# Altium footprint library WR-TBL_Spring Clamp.PcbLib: 258 footprints (part 8 of 17)
Each footprint in its own frame and in the unit in brackets; x right, y up, seen from the top. Pads: shape width x height; smd on the part's side, far side on the other; paste and mask are expansions set on the pad; w line width, h text height; cw(c..) or ccw(c..) is an arc to the next point about the centre after c.
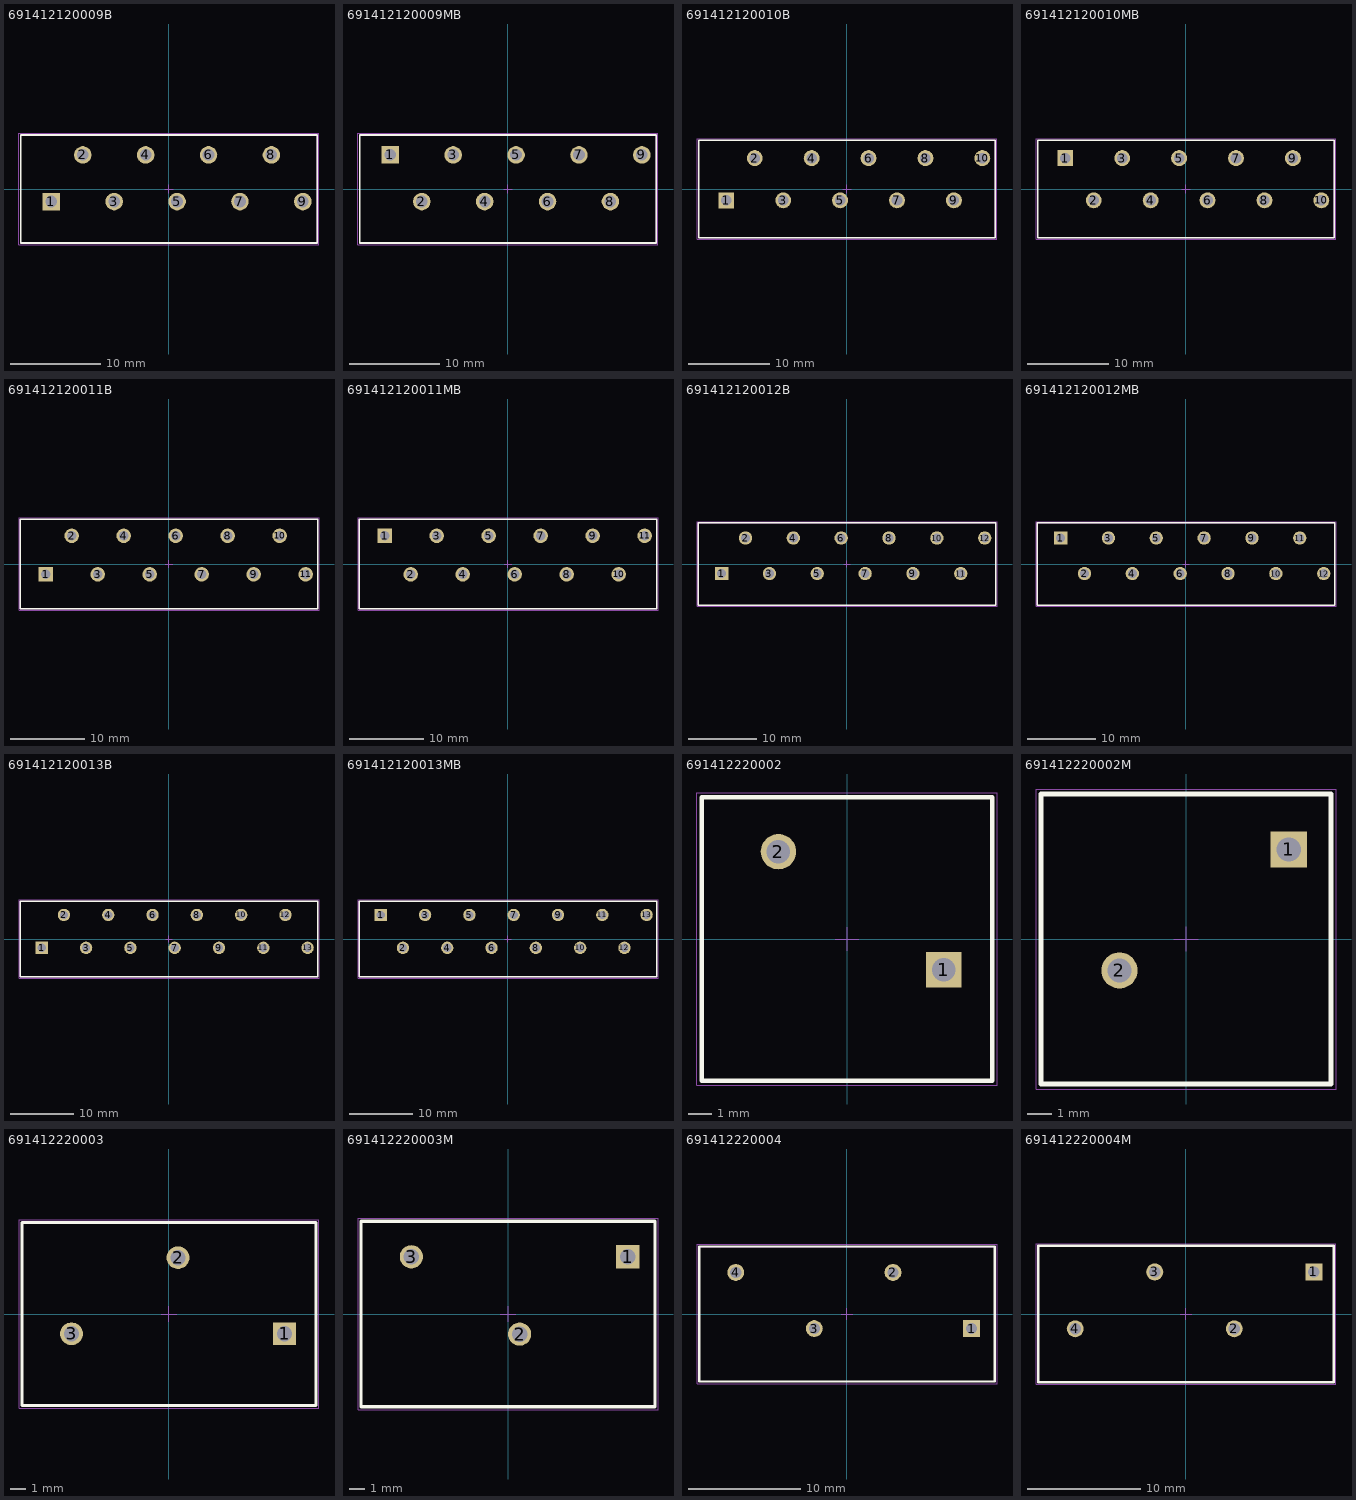
[diagram p7: the footprints below, top view; thin cyan lines are the x and y axes]

## 691412120009B [mm] "3,5mm - Spring clamp/Screw less - 45¡ã entry - 09p"
height 12.8
pads (9):
  rect 1.95x1.95 hole 1.3: 1(-13.1,-1.4)
  round 1.95 hole 1.3: 2(-9.6,3.8) 3(-6.1,-1.4) 4(-2.6,3.8) 5(0.9,-1.4) 6(4.4,3.8) 7(7.9,-1.4) 8(11.4,3.8) 9(14.9,-1.4)
Top Overlay:
  lines w0.2: -16.5,-6 -16.5,6 16.5,6 16.5,-6 -16.5,-6
Mechanical 13:
  lines w0.1: -16.5,-6 16.5,-6 16.5,6 -16.5,6 -16.5,-6
Mechanical 15:
  lines w0.05: -0.5,0 0.5,0 ; 0,-0.5 0,0.5 ; -16.7,-6.2 -16.7,6.2 16.7,6.2 16.7,-6.2 -16.7,-6.2
3D body "691412120009B.stp": height 12.85, standoff -3.45, extent -16.5,-6 16.5,6

## 691412120009MB [mm] "3,5mm - Spring clamp/Screw less - 45¡ã entry - 09p"
height 11.5
pads (9):
  rect 1.95x1.95 hole 1.3: 1(-13.1,3.8)
  round 1.95 hole 1.3: 2(-9.6,-1.4) 3(-6.1,3.8) 4(-2.6,-1.4) 5(0.9,3.8) 6(4.4,-1.4) 7(7.9,3.8) 8(11.4,-1.4) 9(14.9,3.8)
Top Overlay:
  lines w0.2: -16.5,-6 16.5,-6 16.5,6 -16.5,6 -16.5,-6
Mechanical 13:
  lines w0.1: -16.5,-6 -16.5,6 16.5,6 16.5,-6 -16.5,-6
Mechanical 15:
  lines w0.05: -0.5,0 0.5,0 ; 0,-0.5 0,0.5 ; -16.7,-6.2 -16.7,6.2 16.7,6.2 16.7,-6.2 -16.7,-6.2
3D body "691412120009MB.stp": height 12.85, standoff -3.45, extent -16.5,-6 16.5,6

## 691412120010B [mm] "3,5mm - Spring clamp/Screw less - 45¡ã entry - 10p"
height 12.8
pads (10):
  rect 1.95x1.95 hole 1.3: 1(-14.85,-1.4)
  round 1.95 hole 1.3: 2(-11.35,3.8) 3(-7.85,-1.4) 4(-4.35,3.8) 5(-0.85,-1.4) 6(2.65,3.8) 7(6.15,-1.4) 8(9.65,3.8) 9(13.15,-1.4) 10(16.65,3.8)
Top Overlay:
  lines w0.2: -18.25,-6 -18.25,6 18.25,6 18.25,-6 -18.25,-6
Mechanical 13:
  lines w0.1: -18.25,-6 18.25,-6 18.25,6 -18.25,6 -18.25,-6
Mechanical 15:
  lines w0.05: -0.5,0 0.5,0 ; 0,-0.5 0,0.5 ; -18.45,-6.2 -18.45,6.2 18.45,6.2 18.45,-6.2 -18.45,-6.2
3D body "691412120010B.stp": height 12.85, standoff -3.45, extent -18.25,-6 18.25,6

## 691412120010MB [mm] "3,5mm - Spring clamp/Screw less - 45¡ã entry - 10p"
height 11.5
pads (10):
  rect 1.95x1.95 hole 1.3: 1(-14.85,3.8)
  round 1.95 hole 1.3: 2(-11.35,-1.4) 3(-7.85,3.8) 4(-4.35,-1.4) 5(-0.85,3.8) 6(2.65,-1.4) 7(6.15,3.8) 8(9.65,-1.4) 9(13.15,3.8) 10(16.65,-1.4)
Top Overlay:
  lines w0.2: -18.25,-6 -18.25,6 18.25,6 18.25,-6 -18.25,-6
Mechanical 13:
  lines w0.1: -18.25,-6 18.25,-6 18.25,6 -18.25,6 -18.25,-6
Mechanical 15:
  lines w0.05: -0.5,0 0.5,0 ; 0,-0.5 0,0.5 ; -18.45,-6.2 18.45,-6.2 18.45,6.2 -18.45,6.2 -18.45,-6.2
3D body "691412120010MB.stp": height 12.85, standoff -3.45, extent -18.25,-6 18.25,6

## 691412120011B [mm] "3,5mm - Spring clamp/Screw less - 45¡ã entry - 11p"
height 12.8
pads (11):
  rect 1.95x1.95 hole 1.3: 1(-16.6,-1.4)
  round 1.95 hole 1.3: 2(-13.1,3.8) 3(-9.6,-1.4) 4(-6.1,3.8) 5(-2.6,-1.4) 6(0.9,3.8) 7(4.4,-1.4) 8(7.9,3.8) 9(11.4,-1.4) 10(14.9,3.8) 11(18.4,-1.4)
Top Overlay:
  lines w0.2: -20,-6 20,-6 20,6 -20,6 -20,-6
Mechanical 13:
  lines w0.1: -20,-6 -20,6 20,6 20,-6 -20,-6
Mechanical 15:
  lines w0.05: -0.5,0 0.5,0 ; 0,-0.5 0,0.5 ; -20.2,-6.2 20.2,-6.2 20.2,6.2 -20.2,6.2 -20.2,-6.2
3D body "691412120011B.stp": height 12.85, standoff -3.45, extent -20,-6 20,6

## 691412120011MB [mm] "3,5mm - Spring clamp/Screw less - 45¡ã entry - 11p"
height 11.5
pads (11):
  rect 1.95x1.95 hole 1.3: 1(-16.6,3.8)
  round 1.95 hole 1.3: 2(-13.1,-1.4) 3(-9.6,3.8) 4(-6.1,-1.4) 5(-2.6,3.8) 6(0.9,-1.4) 7(4.4,3.8) 8(7.9,-1.4) 9(11.4,3.8) 10(14.9,-1.4) 11(18.4,3.8)
Top Overlay:
  lines w0.2: -20,-6 -20,6 20,6 20,-6 -20,-6
Mechanical 13:
  lines w0.1: -20,-6 20,-6 20,6 -20,6 -20,-6
Mechanical 15:
  lines w0.05: -0.5,0 0.5,0 ; 0,-0.5 0,0.5 ; -20.2,-6.2 20.2,-6.2 20.2,6.2 -20.2,6.2 -20.2,-6.2
3D body "691412120011MB.stp": height 12.85, standoff -3.45, extent -20,-6 20,6

## 691412120012B [mm] "3,5mm - Spring clamp/Screw less - 45¡ã entry - 12p"
height 12.8
pads (12):
  rect 1.95x1.95 hole 1.3: 1(-18.35,-1.4)
  round 1.95 hole 1.3: 2(-14.85,3.8) 3(-11.35,-1.4) 4(-7.85,3.8) 5(-4.35,-1.4) 6(-0.85,3.8) 7(2.65,-1.4) 8(6.15,3.8) 9(9.65,-1.4) 10(13.15,3.8) 11(16.65,-1.4) 12(20.15,3.8)
Top Overlay:
  lines w0.2: -21.75,-6 21.75,-6 21.75,6 -21.75,6 -21.75,-6
Mechanical 13:
  lines w0.1: -21.75,-6 -21.75,6 21.75,6 21.75,-6 -21.75,-6
Mechanical 15:
  lines w0.05: -0.5,0 0.5,0 ; 0,-0.5 0,0.5 ; -21.95,-6.2 21.95,-6.2 21.95,6.2 -21.95,6.2 -21.95,-6.2
3D body "691412120012B.stp": height 12.85, standoff -3.45, extent -21.75,-6 21.75,6

## 691412120012MB [mm] "3,5mm - Spring clamp/Screw less - 45¡ã entry - 12p"
height 11.5
pads (12):
  rect 1.95x1.95 hole 1.3: 1(-18.35,3.8)
  round 1.95 hole 1.3: 2(-14.85,-1.4) 3(-11.35,3.8) 4(-7.85,-1.4) 5(-4.35,3.8) 6(-0.85,-1.4) 7(2.65,3.8) 8(6.15,-1.4) 9(9.65,3.8) 10(13.15,-1.4) 11(16.65,3.8) 12(20.15,-1.4)
Top Overlay:
  lines w0.2: -21.75,-6 -21.75,6 21.75,6 21.75,-6 -21.75,-6
Mechanical 13:
  lines w0.1: -21.75,-6 21.75,-6 21.75,6 -21.75,6 -21.75,-6
Mechanical 15:
  lines w0.05: -0.5,0 0.5,0 ; 0,-0.5 0,0.5 ; -21.95,-6.2 21.95,-6.2 21.95,6.2 -21.95,6.2 -21.95,-6.2
3D body "691412120012MB.stp": height 12.85, standoff -3.45, extent -21.75,-6 21.75,6

## 691412120013B [mm] "3,5mm - Spring clamp/Screw less - 45¡ã entry - 13p"
height 12.8
pads (13):
  rect 1.95x1.95 hole 1.3: 1(-20.1,-1.4)
  round 1.95 hole 1.3: 2(-16.6,3.8) 3(-13.1,-1.4) 4(-9.6,3.8) 5(-6.1,-1.4) 6(-2.6,3.8) 7(0.9,-1.4) 8(4.4,3.8) 9(7.9,-1.4) 10(11.4,3.8) 11(14.9,-1.4) 12(18.4,3.8) 13(21.9,-1.4)
Top Overlay:
  lines w0.2: -23.5,-6 -23.5,6 23.5,6 23.5,-6 -23.5,-6
Mechanical 13:
  lines w0.1: -23.5,-6 23.5,-6 23.5,6 -23.5,6 -23.5,-6
Mechanical 15:
  lines w0.05: -0.5,0 0.5,0 ; 0,-0.5 0,0.5 ; -23.7,-6.2 -23.7,6.2 23.7,6.2 23.7,-6.2 -23.7,-6.2
3D body "691412120013B.stp": height 12.85, standoff -3.45, extent -23.5,-6 23.5,6

## 691412120013MB [mm] "3,5mm - Spring clamp/Screw less - 45¡ã entry - 13p"
height 11.5
pads (13):
  rect 1.95x1.95 hole 1.3: 1(-20.1,3.8)
  round 1.95 hole 1.3: 2(-16.6,-1.4) 3(-13.1,3.8) 4(-9.6,-1.4) 5(-6.1,3.8) 6(-2.6,-1.4) 7(0.9,3.8) 8(4.4,-1.4) 9(7.9,3.8) 10(11.4,-1.4) 11(14.9,3.8) 12(18.4,-1.4) 13(21.9,3.8)
Top Overlay:
  lines w0.2: -23.5,-6 23.5,-6 23.5,6 -23.5,6 -23.5,-6
Mechanical 13:
  lines w0.1: -23.5,-6 -23.5,6 23.5,6 23.5,-6 -23.5,-6
Mechanical 15:
  lines w0.05: -0.5,0 0.5,0 ; 0,-0.5 0,0.5 ; -23.7,-6.2 -23.7,6.2 23.7,6.2 23.7,-6.2 -23.7,-6.2
3D body "691412120013MB.stp": height 12.85, standoff -3.45, extent -23.5,-6 23.5,6

## 691412220002 [mm] "7.00 mm Screwless 45deg Entry, 2p"
height 13.2
pads (2):
  rect 1.5x1.5 hole 1: 1(4.095,-1.3)
  round 1.5 hole 1: 2(-2.905,3.7)
Top Overlay:
  lines w0.2: -6.155,-6 -6.155,6 6.155,6 6.155,-6 -6.155,-6
Mechanical 13:
  lines w0.1: -6.155,-6 6.155,-6 6.155,6 -6.155,6 -6.155,-6
Mechanical 15:
  lines w0.05: -0.5,0 0.5,0 ; 0,-0.5 0,0.5 ; -6.355,-6.2 6.355,-6.2 6.355,6.2 -6.355,6.2 -6.355,-6.2
3D body "691412220002.stp": height 13.28, standoff -3.52, extent -6.155,-6 6.155,6

## 691412220002M [mm] "7.00 mm Screwless 45deg Entry Mirror Version, 2p"
height 13.2
pads (2):
  rect 1.5x1.5 hole 1: 1(4.25,3.7)
  round 1.5 hole 1: 2(-2.75,-1.3)
Top Overlay:
  lines w0.2: -6,-6 -6,6 6,6 6,-6 -6,-6
Mechanical 13:
  lines w0.1: -6,-6 6,-6 6,6 -6,6 -6,-6
Mechanical 15:
  lines w0.05: -0.5,0 0.5,0 ; 0,-0.5 0,0.5 ; -6.2,-6.2 -6.2,6.2 6.2,6.2 6.2,-6.2 -6.2,-6.2
3D body "691412220002M.stp": height 13.28, standoff -3.52, extent -6,-6 6,6

## 691412220003 [mm] "7.00 mm Screwless 45deg Entry, 3p"
height 13.2
pads (3):
  rect 1.5x1.5 hole 1: 1(7.595,-1.3)
  round 1.5 hole 1: 2(0.595,3.7) 3(-6.405,-1.3)
Top Overlay:
  lines w0.2: -9.655,-6 -9.655,6 9.655,6 9.655,-6 -9.655,-6
Mechanical 13:
  lines w0.1: -9.655,-6 9.655,-6 9.655,6 -9.655,6 -9.655,-6
Mechanical 15:
  lines w0.05: -0.5,0 0.5,0 ; 0,-0.5 0,0.5 ; -9.855,-6.2 9.855,-6.2 9.855,6.2 -9.855,6.2 -9.855,-6.2
3D body "691412220003.stp": height 13.28, standoff -3.52, extent -9.655,-6 9.655,6

## 691412220003M [mm] "7.00 mm Screwless 45deg Entry Mirror Version, 3p"
height 13.2
pads (3):
  rect 1.5x1.5 hole 1: 1(7.75,3.7)
  round 1.5 hole 1: 2(0.75,-1.3) 3(-6.25,3.7)
Top Overlay:
  lines w0.2: -9.5,-6 -9.5,6 9.5,6 9.5,-6 -9.5,-6
Mechanical 13:
  lines w0.1: -9.5,-6 9.5,-6 9.5,6 -9.5,6 -9.5,-6
Mechanical 15:
  lines w0.05: -0.5,0 0.5,0 ; 0,-0.5 0,0.5 ; -9.7,-6.2 -9.7,6.2 9.7,6.2 9.7,-6.2 -9.7,-6.2
3D body "691412220003M.stp": height 13.28, standoff -3.52, extent -9.5,-6 9.5,6

## 691412220004 [mm] "7.00 mm Screwless 45deg Entry, 4p"
height 13.2
pads (4):
  rect 1.5x1.5 hole 1: 1(11.095,-1.3)
  round 1.5 hole 1: 2(4.095,3.7) 3(-2.905,-1.3) 4(-9.905,3.7)
Top Overlay:
  lines w0.2: -13.155,-6 13.155,-6 13.155,6 -13.155,6 -13.155,-6
Mechanical 13:
  lines w0.1: -13.155,-6 -13.155,6 13.155,6 13.155,-6 -13.155,-6
Mechanical 15:
  lines w0.05: -0.5,0 0.5,0 ; 0,-0.5 0,0.5 ; -13.355,-6.2 -13.355,6.2 13.355,6.2 13.355,-6.2 -13.355,-6.2
3D body "691412220004.stp": height 13.28, standoff -3.52, extent -13.155,-6 13.155,6

## 691412220004M [mm] "7.00 mm Screwless 45deg Entry Mirror Version, 4p"
height 13.2
pads (4):
  rect 1.5x1.5 hole 1: 1(11.25,3.7)
  round 1.5 hole 1: 2(4.25,-1.3) 3(-2.75,3.7) 4(-9.75,-1.3)
Top Overlay:
  lines w0.2: -13,-6 13,-6 13,6 -13,6 -13,-6
Mechanical 13:
  lines w0.1: -13,-6 -13,6 13,6 13,-6 -13,-6
Mechanical 15:
  lines w0.05: -0.5,0 0.5,0 ; 0,-0.5 0,0.5 ; -13.2,-6.2 13.2,-6.2 13.2,6.2 -13.2,6.2 -13.2,-6.2
3D body "691412220004M.stp": height 13.28, standoff -3.52, extent -13,-6 13,6